# Altium footprint library my Library.PcbLib: 1247 footprints (part 58 of 78)
Each footprint in its own frame and in the unit in brackets; x right, y up, seen from the top. Pads: shape width x height; smd on the part's side, far side on the other; paste and mask are expansions set on the pad; w line width, h text height; cw(c..) or ccw(c..) is an arc to the next point about the centre after c.
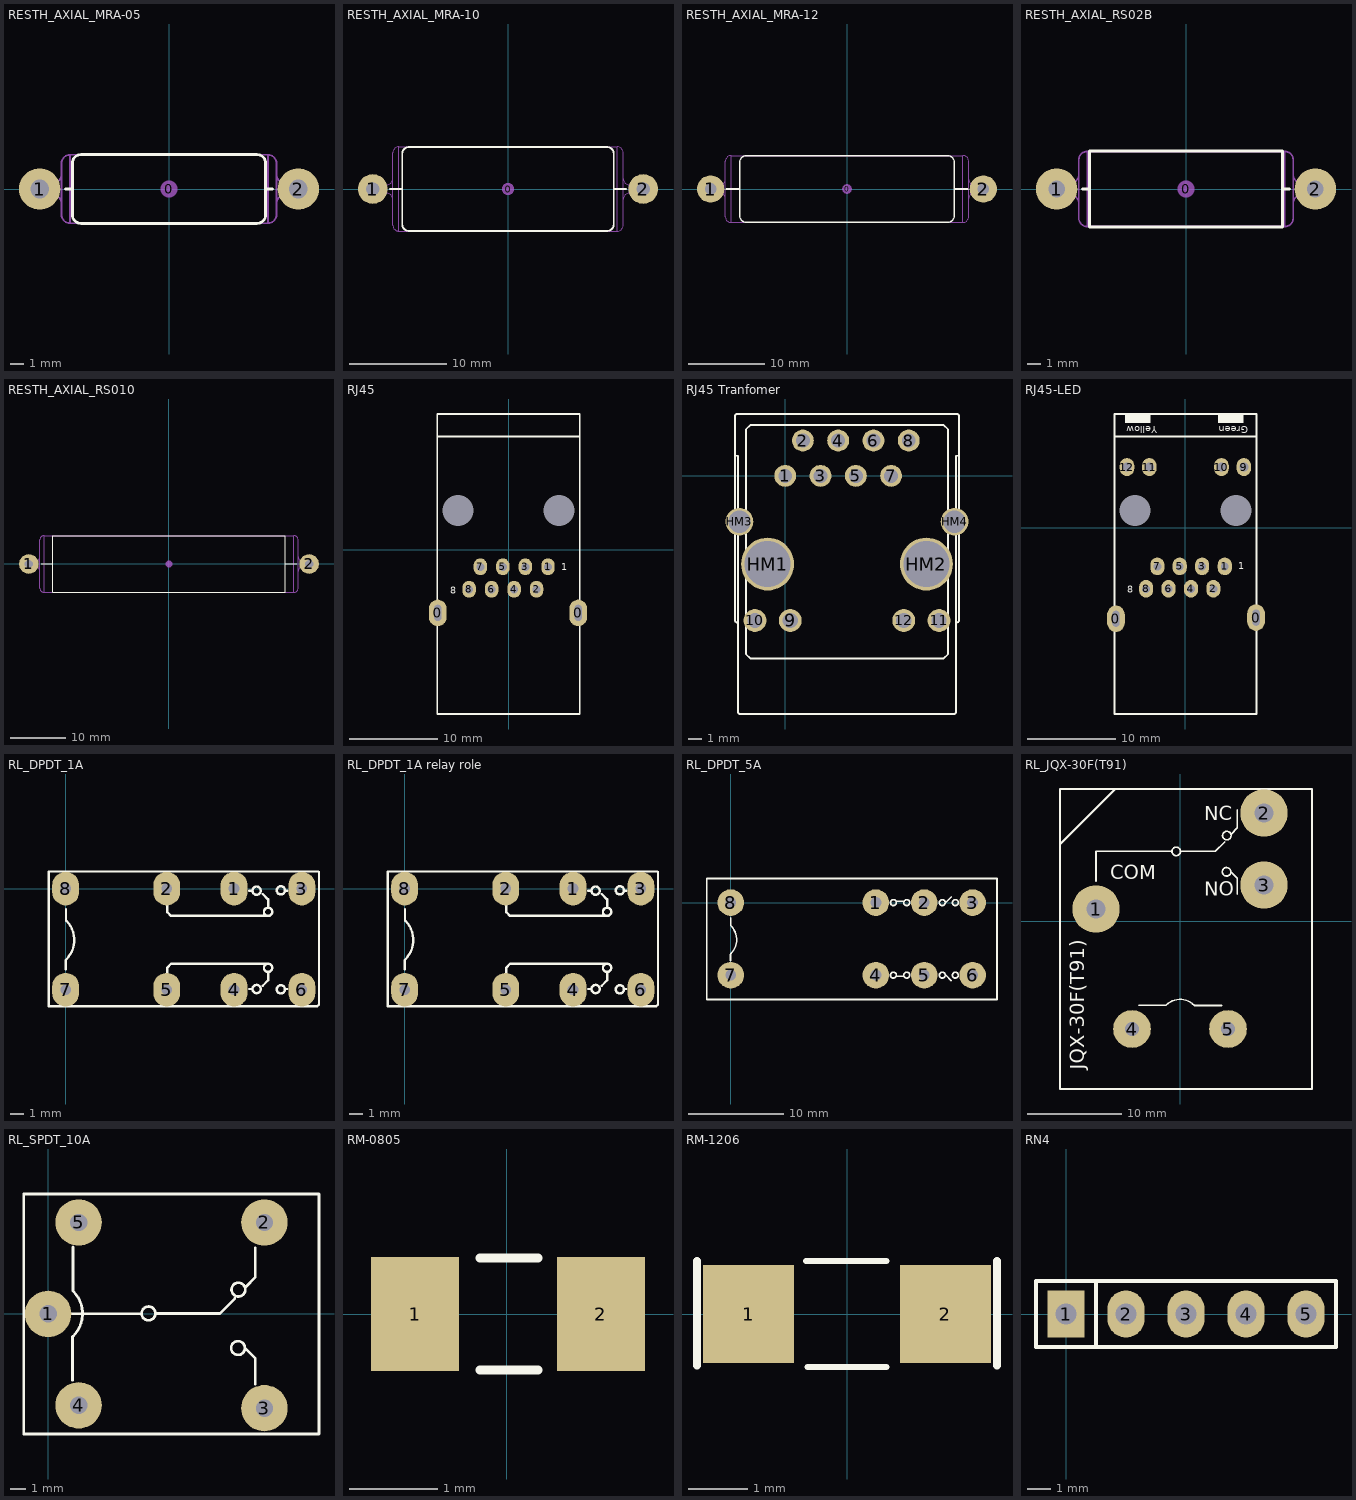
[diagram p57: the footprints below, top view; thin cyan lines are the x and y axes]

## RESTH_AXIAL_MRA-05 [mil] "MRA-05 Axial Resistor Thru-Hole; 2 Leads"
height 198
pads (3):
  round 50 on Mech15: 0(0,0)
  round 120 hole 54: 1(-375,0) 2(375,0)
Top Overlay:
  lines w7.87: -300,0 -280,0 ; 280,0 300,0 ; -280,-75 ccw(c-255,-75) -255,-100 255,-100 ccw(c255,-75) 280,-75 280,75 ccw(c255,75) 255,100 -255,100 ccw(c-255,75) -280,75 -280,-75
Mechanical 13:
  lines w5: -337,-16.89 -337,17 ; -312,-42 ccw(c-337,-42) -337,-17 -375,-17 cw(c-375,0) -375,17 -337,17 ; -312,42 cw(c-337,42) -337,17 ; 312,-42 cw(c337,-42) 337,-17 ; 312,42 ccw(c337,42) 337,17 375,17 cw(c375,0) 375,-17 337,-17 ; 337,16.89 337,-17 ; -341,-17 -341,-16.98 ; -341,-16.98 -341,-16.52 -341,-15.46 -341,-13.85 -341,-11.73 -341,-9.19 -341,-6.32 -341,-3.22 -341,0 -341,3.22 -341,6.32 -341,9.19 -341,11.73 -341,13.85 -341,15.46 -341,16.52 -341,16.98 ; -341,16.98 -341,17 ; -287,-99 cw(c-287,-74) -312,-74 -312,74 cw(c-287,74) -287,99 ; -287,-99 287,-99 ; -287,-99 -287,99 ; -287,99 287,99 ; 287,-99 ccw(c287,-74) 312,-74 312,74 ccw(c287,74) 287,99 ; 287,-99 287,99 ; 341,-17 341,-16.98 ; 341,-16.98 341,-16.52 341,-15.46 341,-13.85 341,-11.73 341,-9.19 341,-6.32 341,-3.22 341,0 341,3.22 341,6.32 341,9.19 341,11.73 341,13.85 341,15.46 341,16.52 341,16.98 ; 341,16.98 341,17
3D body "Power Res MRA-05.STEP": height 197.22, standoff -100, extent -391.99,-98.8 392.01,98.81

## RESTH_AXIAL_MRA-10 [mil] "MRA-10 Axial Resistor Thru-Hole; 2 Leads"
height 343
pads (3):
  round 50 on Mech15: 0(0,0)
  round 120 hole 54: 1(-550,0) 2(550,0)
Top Overlay:
  lines w7.87: -480,0 -430,0 ; 430,0 480,0 ; -430,-145 ccw(c-405,-145) -405,-170 405,-170 ccw(c405,-145) 430,-145 430,145 ccw(c405,145) 405,170 -405,170 ccw(c-405,145) -430,145 -430,-145
Mechanical 13:
  lines w5: -516,-17 -516,17 ; -493.5,-16.89 -493.5,17 ; -468.5,-42 ccw(c-493.5,-42) -493.5,-17 -550,-17 cw(c-550,0) -550,17 -493.5,17 ; -468.5,42 cw(c-493.5,42) -493.5,17 ; 468.5,-42 cw(c493.5,-42) 493.5,-17 ; 468.5,42 ccw(c493.5,42) 493.5,17 550,17 cw(c550,0) 550,-17 493.5,-17 ; 493.5,16.89 493.5,-17 ; 516,-17 516,17 ; -443.5,-171.5 cw(c-443.5,-146.5) -468.5,-146.5 -468.5,146.5 cw(c-443.5,146.5) -443.5,171.5 ; -443.5,-171.5 443.5,-171.5 ; -443.5,-171.5 -443.5,171.5 ; -443.5,171.5 443.5,171.5 ; 443.5,-171.5 ccw(c443.5,-146.5) 468.5,-146.5 468.5,146.5 ccw(c443.5,146.5) 443.5,171.5 ; 443.5,-171.5 443.5,171.5
3D body "Power Res MRA-10.STEP": height 341.65, standoff -100, extent -566.99,-171.16 567,171.17

## RESTH_AXIAL_MRA-12 [mil] "MRA-12 Axial Resistor Thru-Hole; 2 Leads"
height 343
pads (3):
  round 50 on Mech15: 0(0,0)
  round 140 hole 60: 1(-700,0) 2(700,0)
Top Overlay:
  lines w7.87: -620,0 -550,0 ; 550,0 620,0 ; -550,-139.99 ccw(c-520,-139.99) -520,-169.99 520,-170 ccw(c519.99,-139.99) 549.99,-139.99 550,140 ccw(c519.99,140) 519.99,170 -520,170 ccw(c-520,140) -550,140 -550,-140
Mechanical 13:
  lines w5: -666,-17 -666,17 ; -625,-47 ccw(c-655,-47) -655,-17 ; -625,47 cw(c-655,47) -655,17 ; 625,-47 cw(c655,-47) 655,-17 ; 625,47 ccw(c655,47) 655,17 ; 666,-17 666,17 ; -655,-17 -700,-17 cw(c-700,0) -700,17 -655,17 ; -655,-17 -655,17 ; -595,-171.5 cw(c-595,-141.5) -625,-141.5 -625,141.5 cw(c-595,141.5) -595,171.5 ; -595,-171.5 595,-171.5 ; -595,-171.5 -595,171.5 ; -595,171.5 595,171.5 ; 595,-171.5 ccw(c595,-141.5) 625,-141.5 625,141.5 ccw(c595,141.5) 595,171.5 ; 595,-171.5 595,171.5 ; 655,-17 700,-17 ccw(c700,0) 700,17 655,17 ; 655,-17 655,17
3D body "Power Res MRA-12.STEP": height 341.65, standoff -100, extent -717,-171.15 717,171.17

## RESTH_AXIAL_RS02B [mil] "Axial Resistor Thru-Hole; 2 Leads"
height 218
pads (3):
  round 50 on Mech15: 0(0,0)
  round 120 hole 48: 1(-375,0) 2(375,0)
Top Overlay:
  lines w7.87: -300,0 -280,0 ; 280,0 300,0 ; -280,-110 280,-110 280,110 -280,110 -280,-110
Mechanical 13:
  lines w5: -341,-17 -341,17 ; -311,-42 ccw(c-336,-42) -336,-17 ; -311,42 cw(c-336,42) -336,17 ; 311,-42 cw(c336,-42) 336,-17 ; 311,42 ccw(c336,42) 336,17 ; 341,-17 341,17 ; -336,-17 -336,17 ; -336,-17 -375,-17 cw(c-375,0) -375,17 -336,17 ; -286,-109 cw(c-286,-84) -311,-84 -311,84 cw(c-286,84) -286,109 ; -286,-109 -286,109 ; -286,-109 286,-109 ; -286,109 286,109 ; 286,-109 ccw(c286,-84) 311,-84 311,84 ccw(c286,84) 286,109 ; 286,-109 286,109 ; 336,-17 336,17 ; 336,-17 375,-17 ccw(c375,0) 375,17 336,17
3D body "Power Res RS02B.STEP": height 217.14, standoff -100, extent -392,-108.78 392,108.79

## RESTH_AXIAL_RS010 [mil] "Axial Resistor Thru-Hole; 2 Leads"
height 406
pads (3):
  round 50 on Mech15: 0(0,0)
  round 140 hole 60: 1(-1000,0) 2(1000,0)
Top Overlay:
  lines w7.87: -910,0 -830,0 ; 830,0 910,0 ; -830,-200 830,-200 830,200 -830,200 -830,-200
Mechanical 13:
  lines w5: -958,-21 -958,21 ; -921,-51 ccw(c-951,-51) -951,-21 ; -921,51 cw(c-951,51) -951,21 ; 921,-51 cw(c951,-51) 951,-21 ; 921,51 ccw(c951,51) 951,21 ; 958,-21 958,21 ; -951,-21 -951,21 ; -951,-21 -1000,-21 cw(c-1000,0) -1000,21 -951,21 ; -891,-203 cw(c-891,-173) -921,-173 -921,173 cw(c-891,173) -891,203 ; -891,-203 -891,203 ; -891,-203 891,-203 ; -891,203 891,203 ; 891,-203 ccw(c891,-173) 921,-173 921,173 ccw(c891,173) 891,203 ; 891,-203 891,203 ; 951,-21 951,21 ; 951,-21 1000,-21 ccw(c1000,0) 1000,21 951,21
3D body "Power Res RS010.STEP": height 404.4, standoff -100, extent -1020.99,-202.59 1021,202.61

## RJ45 [mm] "Single Port RJ45 Connector with Intergrated Magetic (LAN) - NonLED"
pads (12):
  oval 2x3 hole 0.8 slot 1.8 at 90 deg: 0(-8.001,-7.112) 0(7.874,-7.112)
  oval 1.524x1.905 hole 0.9: 1(4.458,-1.905) 2(3.162,-4.445) 3(1.892,-1.905)
  oval 1.524x1.905 hole 0.9 paste+2.54: 4(0.622,-4.445) 5(-0.648,-1.905) 6(-1.918,-4.445) 7(-3.188,-1.905) 8(-4.458,-4.445)
  round 2 hole 3.5 paste+2.54: Hole1(-5.715,4.445) Hole1(5.715,4.445)
Top Overlay:
  lines w0.203: -8.05,12.825 8.05,12.825 ; -8.05,-18.542 -3.898,-18.542 3.39,-18.542 8.05,-18.542 8.05,15.365 -8.05,15.365 -8.05,-18.542
  text "8" at -6.604,-4.953 h0.8
  text "1" at 5.969,-2.286 h0.8
3D body "User Library-XPort.STEP": height 13.76, standoff -3.7, extent -8.98,-18.751 8.763,15.449

## RJ45 Tranfomer [mm]
pads (16):
  round 1.575 hole 1: 1(0,0) 2(1.27,2.54) 3(2.54,0) 4(3.81,2.54) 5(5.08,0) 6(6.35,2.54) 7(7.62,0) 8(8.89,2.54)
  round 1.65 hole 1.1: 9(0.36,-10.41) 10(-2.18,-10.41) 11(11.07,-10.41) 12(8.53,-10.41)
  round 3.81 hole 3.3: HM1(-1.27,-6.35) HM2(10.16,-6.35)
  round 2 hole 1.6: HM3(-3.3,-3.3) HM4(12.19,-3.3)
Top Overlay:
  lines w0.127: -3.62,1.45 -3.405,1.45 -3.405,-16.99 ccw(c-3.255,-16.99) -3.255,-17.14 12.145,-17.14 ccw(c12.145,-16.99) 12.295,-16.99 12.295,1.45 12.51,1.45 ; -3.405,-10.55 -3.47,-10.55 cw(c-3.47,-10.4) -3.62,-10.4 -3.62,4.3 cw(c-3.47,4.3) -3.47,4.45 12.36,4.45 cw(c12.36,4.3) 12.51,4.3 12.51,-10.4 cw(c12.36,-10.4) 12.36,-10.55 12.295,-10.55 ; -3.405,-3.81 -3.195,-3.81 -3.195,-2.79 -3.405,-2.79 ; -3.405,-3.61 -3.195,-3.61 ; -3.405,-2.99 -3.195,-2.99 ; -1.77,-7.764 cw(c-1.27,-6.35) -1.517,-7.829 ; -0.77,-7.764 ccw(c-1.27,-6.35) -0.77,-4.936 ; -0.132,-0.1 -0.132,0.1 ; 0.132,-0.1 0.132,0.1 ; 1.138,2.44 1.138,2.64 ; 1.402,2.44 1.402,2.64 ; 2.408,-0.1 2.408,0.1 ; 2.672,-0.1 2.672,0.1 ; 3.678,2.44 3.678,2.64 ; 3.942,2.44 3.942,2.64 ; 4.948,-0.1 4.948,0.1 ; 5.212,-0.1 5.212,0.1 ; 6.218,2.44 6.218,2.64 ; 6.482,2.44 6.482,2.64 ; 7.488,-0.1 7.488,0.1 ; 7.752,-0.1 7.752,0.1 ; 8.758,2.44 8.758,2.64 ; 9.022,2.44 9.022,2.64 ; 9.66,-7.764 cw(c10.16,-6.35) 9.66,-4.936 ; 10.16,-7.85 cw(c10.16,-6.35) 10.66,-7.764 ; 12.085,-3.61 12.295,-3.61 ; 12.085,-2.99 12.295,-2.99 ; 12.295,-3.81 12.085,-3.81 12.085,-2.79 12.295,-2.79 ; -2.82,-12.84 -2.52,-13.14 11.41,-13.14 11.71,-12.84 11.71,3.35 11.41,3.65 -2.52,3.65 -2.82,3.35 -2.82,-12.84 ; -2.43,-10.61 -1.93,-10.61 -1.93,-10.21 -2.43,-10.21 -2.43,-10.61 ; -1.77,-7.386 cw(c-1.27,-6.35) -1.77,-5.314 -1.77,-7.386 ; -0.77,-7.386 ccw(c-1.27,-6.35) -0.77,-5.314 -0.77,-7.386 ; -0.175,-0.1 0.175,-0.1 0.175,0.1 -0.175,0.1 -0.175,-0.1 ; 0.11,-10.61 0.61,-10.61 0.61,-10.21 0.11,-10.21 0.11,-10.61 ; 1.095,2.44 1.445,2.44 1.445,2.64 1.095,2.64 1.095,2.44 ; 2.365,-0.1 2.715,-0.1 2.715,0.1 2.365,0.1 2.365,-0.1 ; 3.635,2.44 3.985,2.44 3.985,2.64 3.635,2.64 3.635,2.44 ; 4.905,-0.1 4.905,0.1 5.255,0.1 5.255,-0.1 4.905,-0.1 ; 6.175,2.44 6.175,2.64 6.525,2.64 6.525,2.44 6.175,2.44 ; 7.445,-0.1 7.795,-0.1 7.795,0.1 7.445,0.1 7.445,-0.1 ; 8.28,-10.61 8.78,-10.61 8.78,-10.21 8.28,-10.21 8.28,-10.61 ; 8.715,2.44 9.065,2.44 9.065,2.64 8.715,2.64 8.715,2.44 ; 9.66,-7.386 cw(c10.16,-6.35) 9.66,-5.314 9.66,-7.386 ; 10.66,-7.386 ccw(c10.16,-6.35) 10.66,-5.314 10.66,-7.386 ; 10.82,-10.61 11.32,-10.61 11.32,-10.21 10.82,-10.21 10.82,-10.61
3D body "RJ45-SI-60062-F.STEP": height 13.84, standoff -3.35, extent -3.62,-17.143 12.51,4.447

## RJ45-LED [mm] "Single Port RJ45 Connector with Intergrated Magetic (LAN) - Tranformer & LED"
pads (16):
  oval 2x3 hole 0.8 slot 1.8 at 90 deg: 0(-7.874,-10.287) 0(8.001,-10.16)
  oval 1.6x2 hole 0.9: 1(4.458,-4.355) 2(3.162,-6.895) 3(1.892,-4.355)
  oval 1.6x2 hole 0.9 paste+2.54: 4(0.622,-6.895) 5(-0.648,-4.355) 6(-1.918,-6.895) 7(-3.188,-4.355) 8(-4.458,-6.895)
  oval 1.651x2.032 hole 1: 9(6.625,6.895) 10(4.085,6.895) 11(-4.085,6.895) 12(-6.625,6.895)
  round 2 hole 3.5 paste+2.54: Hole1(-5.715,1.995) Hole1(5.715,1.995)
Top Overlay:
  rectangle: -6.858,11.901 -3.937,12.79
  rectangle: 3.683,11.901 6.604,12.79
  lines w0.203: -8.05,10.375 8.05,10.375 ; -8.05,-21.082 -8.05,12.915 8.05,12.915 8.05,-21.082 -8.05,-21.082
  text "Yellow" at -3.175,11.52 h0.8
  text "Green" at 7.112,11.52 h0.8
  text "1" at 5.969,-4.699 h0.8
  text "8" at -6.604,-7.366 h0.8
3D body "User Library-XPort.STEP": height 13.76, standoff -3.7, extent -8.872,-21.246 8.872,12.954

## RL_DPDT_1A [mil] "Reley DPDT, 8 pin, 1A, W400mil, L800mil,H 300mil"
height 300
pads (8):
  oval 80x100 hole 32: 1(500,0) 2(300,0) 3(701,0) 4(500,-300) 5(300,-300) 6(701,-300) 7(0,-300) 8(0,0)
Top Overlay:
  circle w7: c638.76,-299 r12.24
  circle w7: c566.76,-298 r12.24
  circle w7: c600.76,-235 r12.24
  circle w7: c600.76,-69 r12.24
  circle w7: c566.76,-6 r12.24
  circle w7: c638.76,-5 r12.24
  lines w7: 0,-239 0,-212 ; 1,-211 ccw(c-56.5,-152.5) 2,-95 ; 1,-94 1,-61 ; 302,-255 302,-234 313,-223 599,-223 ; 302,-42 302,-70 313,-81 599,-81 ; 544,-298 552,-298 ; 544,-6 552,-6 ; 585,-288 601,-272 601,-249 ; 585,-16 601,-32 601,-55 ; 653,-298 658,-298 ; 653,-6 658,-6 ; -50,-349 -50,51 750,51 752,49 752,-344 747,-349 -50,-349
3D body "SW3dPS-DSY2Y.STEP": height 484.25, standoff -118.11, extent -59.45,-340 759.45,45.83

## RL_DPDT_1A relay role [mil] "Reley DPDT, 8 pin, 1A, W400mil, L800mil,H 300mil"
height 300
pads (8):
  oval 80x100 hole 32: 1(500,0) 2(300,0) 3(701,0) 4(500,-300) 5(300,-300) 6(701,-300) 7(0,-300) 8(0,0)
Top Overlay:
  circle w7: c638.76,-5 r12.24
  circle w7: c566.76,-6 r12.24
  circle w7: c600.76,-69 r12.24
  circle w7: c600.76,-235 r12.24
  circle w7: c566.76,-298 r12.24
  circle w7: c638.76,-299 r12.24
  lines w7: 0,-239 0,-212 ; 1,-211 ccw(c-56.5,-152.5) 2,-95 ; 1,-94 1,-61 ; 302,-255 302,-234 313,-223 599,-223 ; 302,-42 302,-70 313,-81 599,-81 ; 544,-298 552,-298 ; 544,-6 552,-6 ; 585,-288 601,-272 601,-249 ; 585,-16 601,-32 601,-55 ; 653,-298 658,-298 ; 653,-6 658,-6 ; -50,-349 747,-349 752,-344 752,49 750,51 -50,51 -50,-349
3D body "SW3dPS-DSY2Y.STEP": height 484.25, standoff -118.11, extent -59.45,-340 759.45,45.83

## RL_DPDT_5A [mil] "Reley DPDT, 8 pin, 5A, W500mil, L1100mil,H 950mil"
height 300
pads (8):
  round 110 hole 45: 1(600,0) 2(800,0) 3(1000,0) 4(600,-300) 5(800,-300) 6(1000,-300) 7(0,-300) 8(0,0)
Top Overlay:
  circle w7: c928.76,-300 r12.24
  circle w7: c874.76,-300 r12.24
  circle w7: c727.76,-300 r12.24
  circle w7: c672.76,-300 r12.24
  circle w7: c672.76,0 r12.24
  circle w7: c727.76,0 r12.24
  circle w7: c874.76,0 r12.24
  circle w7: c928.76,0 r12.24
  lines w7: -1,-240 -1,-213 ; 0,-212 ccw(c-57.5,-153.5) 1,-96 ; 0,-95 0,-62 ; 687,-305 716,-305 ; 687,5 716,5 ; 888,-299 912,-323 ; 888,-1 912,23 ; -99,-401 1101,-401 1101,100 -99,100 -99,-401

## RL_JQX-30F(T91) [mm] "Relay SPDT, 5 pin, 30A,W 32.1mm, L 26.9mil, H 28.0mil"
height 20.32
pads (5):
  round 5 hole 2: 1(-8.89,1.27) 2(8.89,11.43) 3(8.89,3.81)
  round 4 hole 1.5: 4(-5.08,-11.43) 5(5.08,-11.43)
Top Overlay:
  circle w0.178: c4.933,5.207 r0.452
  circle w0.178: c4.958,9.042 r0.452
  circle w0.178: c-0.401,7.366 r0.452
  lines w0.178: -8.89,4.191 -8.89,7.366 -0.889,7.366 ; -4.369,-8.915 -1.473,-8.915 ; -1.448,-8.89 cw(c0.013,-10.376) 1.499,-8.915 ; 0.102,7.366 3.734,7.366 4.724,8.357 ; 1.524,-8.941 4.394,-8.941 ; 5.385,5.207 6.071,4.521 6.071,2.845 ; 5.41,9.195 6.071,9.855 6.071,11.786
  lines w0.254: -12.7,8.128 -6.858,13.97 ; -12.7,-17.78 -12.7,13.97 13.97,13.97 13.97,-17.78 -12.7,-17.78
  text "COM" at -7.366,4.445 h1.52
  text "JQX-30F(T91)" at -10.16,-15.748 h1.52
  text "NC" at 2.54,10.668 h1.52
  text "NO" at 2.54,2.667 h1.52

## RL_SPDT_10A [mil] "Relay SPDT, 5 pin, 10A,W 650mil, L 800mil, H 800mil"
height 800
pads (5):
  round 120 hole 45: 1(0,0) 2(559.06,236.22) 3(559.06,-243.78) 4(78.74,-236.22) 5(78.74,236.22)
Top Overlay:
  circle w7: c491.79,62.82 r17.8
  circle w7: c490.79,-88.18 r17.8
  circle w7: c259.42,1.12 r17.8
  lines w7: 34.97,0.12 239.22,0.12 ; 63.22,-171.88 63.22,-58.88 ; 64.22,-57.88 ccw(c6.72,0.62) 65.22,58.12 ; 64.22,59.12 64.22,173.12 ; 279.22,1.12 443.6,1.12 ; 443.6,1.02 482.6,40.02 ; 508.6,-88.18 535.6,-115.18 535.6,-181.18 ; 509.6,68.82 535.6,94.82 535.6,170.82 ; -63.4,-310.6 700,-310.6 700,310 -63.4,310 -63.4,-310.6
  lines w10: 553.61,232.5 557.91,236.8
3D body "User Library-SONGLE Relay SRU-12VDC-SL-C.STEP": height 602.36, standoff -196.85, extent -55.1,-305.92 696.87,304.32

## RM-0805 [mm] "Resistor SMD 80x50mil"
height 1.27
pads (2):
  rect 1x1.3 smd: 1(-1.041,0) 2(1.067,0)
Top Overlay:
  lines w0.102: -0.305,-0.635 0.356,-0.635 ; -0.305,0.635 0.356,0.635
3D body "User Library-Resistor-4.STEP": height 0.58, standoff -0.03, extent -0.965,-0.635 1.035,0.615

## RM-1206 [mil] "Resistor SMD 120x60mil"
height 50
pads (2):
  rect 60x65 smd: 1(-65,0) 2(65,0)
Top Overlay:
  lines w4: -27,35 26,35 ; -26,-35 26,-35
  lines w5: -99,-34 -99,35 ; 99,-34 99,35
3D body "User Library-res1206.STEP": height 24.79, standoff 0, extent -82.68,-35 82.68,35.87

## RN4 [mil] "R SIP4, 5 Pin"
height 200
pads (5):
  rect 62x78.74 hole 35: 1(0,0)
  oval 62x78.74 hole 35: 2(100,0) 3(200,0) 4(300,0) 5(400,0)
Top Overlay:
  lines w7: 50,-55 50,55 ; -50,-55 450,-55 450,55 -50,55 -50,-55